# Altium schematic symbol library TI Amplifiers and Linear Special Function Amplifier.SchLib: 708 symbols (part 4 of 34)
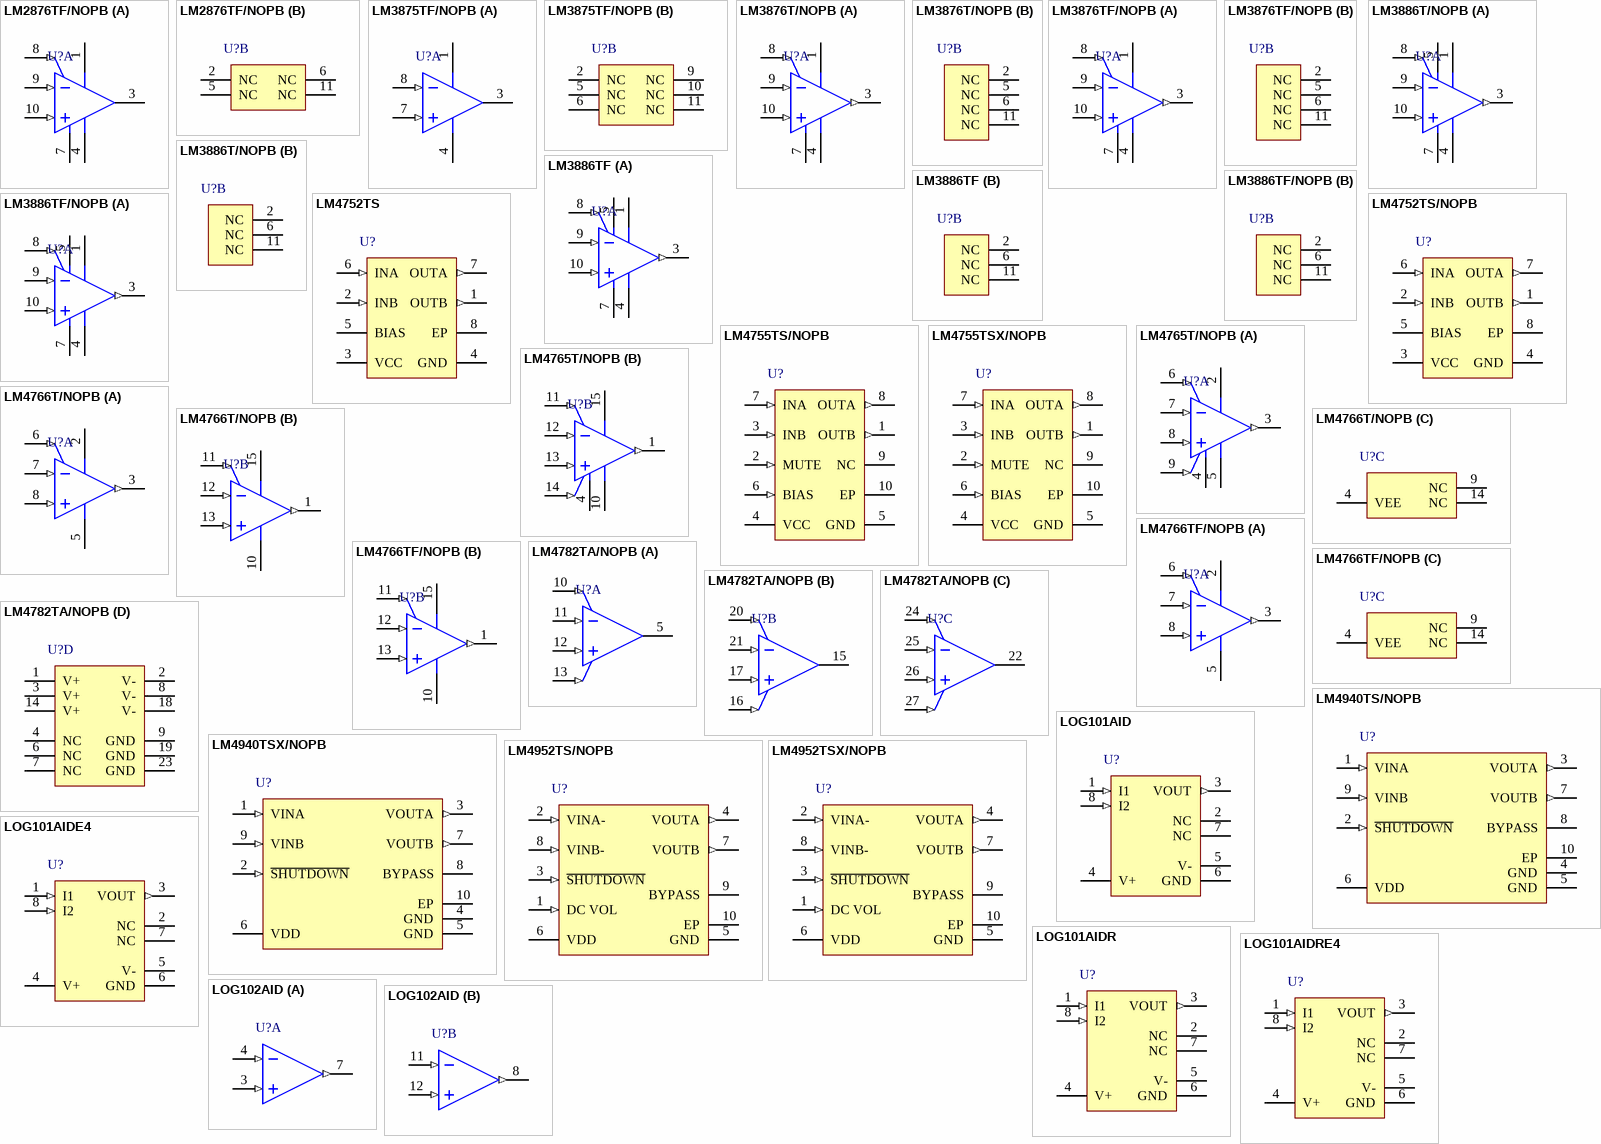
[diagram p42: symbols LM2876TF/NOPB to LOG102AID]

## LM4952TSX/NOPB
designator U?
3.1 W Stereo-SE Audio Power Amplifier with DC Volume Control, -40 to 85 degC, 9-pin DPAK (KTW9), Pb-Free (RoHS Exempt); Manufacturer: Texas Instruments; PartNumber: LM4952TSX/NOPB; Input Type: Analog; Max. Number of Speaker Outputs: 2; SubFamily: Mid/High-Power Amplifier; DatasheetVersion: SNAS230A; PackageVersion: Rev. B, 04/2013; PackageReference: TI-KTW9; PackageDescription: 9-Pin Plastic Flange Mount, Bdoy 10.16 x 4.57 mm, Pitch 0.97 mm; Supplier 1: Digi-Key; Supplier Part Number 1: LM4952TSX/NOPB-ND; Supplier 2: Mouser; Supplier Part Number 2: 926-LM4952TSX/NOPB; Eco-Plan: Pb-Free (RoHS Exempt); Mounting Technology: Through Hole; ComponentLink1Description: Manufacturer URL; ComponentLink1URL: http://www.ti.com/; ComponentLink2Description: Datasheet; ComponentLink2URL: http://www.ti.com/general/docs/lit/getliterature.tsp?genericPartNumber=LM4952&fileType=pdf; ComponentLink3Description: Package Specification; ComponentLink3URL: http://www.ti.com/lit/ml/mpsf047/mpsf047.pdf
footprint TI-KTW9_N (DPAK, 9-Leads, Body 10.16x8.69mm, Pitch 0.97mm, IPC Medium Density)
footprint TI-KTW9_L (DPAK, 9-Leads, Body 10.16x8.69mm, Pitch 0.97mm, IPC High Density)
footprint TI-KTW9_M (DPAK, 9-Leads, Body 10.16x8.69mm, Pitch 0.97mm, IPC Low Density)
pins: 1 DC VOL (in), 2 VINA- (in), 3 ~{SHUTDOWN} (in), 4 VOUTA (out), 5 GND (power), 6 VDD (power), 7 VOUTB (out), 8 VINB- (in), 9 BYPASS, 10 EP

## LOG101AID
designator U?
Logarithmic Amplifier, -40 to 85 degC, 8-pin SOIC (D8), Green (RoHS & no Sb/Br); Manufacturer: Texas Instruments; PartNumber: LOG101AID; Conformity Error (initial 5 decades)(Max)(%): 0.2; Full-Scale Output Voltage(Max)(+/- V): 1.5; Full-Scale Output Voltage(Min)(+/- V): 1.2; Input Current Range(Max)(mA): 3.5; Input Current Range(Min)(nA): 0.1; Reference Type: External; Scale Factor(V/decade): 1; Vs (+/-)(Max)(V): 18; Vs (+/-)(Min)(V): 4.5; DatasheetVersion: SBOS242B; PackageVersion: 4040047-3/M, 06/2011; PackageReference: D8; PackageDescription: 8-Pin Plastic Small Outline, Body 4.9 x 3.9 mm, Pitch 1.27 mm; Supplier 1: Digi-Key; Supplier Part Number 1: 296-12850-5-ND; Supplier 2: Newark; Supplier Part Number 2: 75C0874; Supplier 3: Mouser; Supplier Part Number 3: 595-LOG101AID; Eco-Plan: Green (RoHS & no Sb/Br); Iq(Max)(mA): 1.5; Offset Voltage (Input Amplifiers)(Max)(mV): 1.5; SubFamily: Logarithmic Amplifier; Mounting Technology: Surface Mount; Code_JEDEC: MS-012; ComponentLink1Description: Manufacturer URL; ComponentLink1URL: http://www.ti.com/; ComponentLink2Description: Datasheet; ComponentLink2URL: http://www.ti.com/general/docs/lit/getliterature.tsp?genericPartNumber=LOG101&fileType=pdf; ComponentLink3Description: Package Specification; ComponentLink3URL: http://www.ti.com/litv/pdf/msoi002j
footprint TI-D8_N (SOIC, 8-Leads, Body 5x4mm, Pitch 1.27mm, IPC Medium Density)
footprint TI-D8_L (SOIC, 8-Leads, Body 5x4mm, Pitch 1.27mm, IPC High Density)
footprint TI-D8_M (SOIC, 8-Leads, Body 5x4mm, Pitch 1.27mm, IPC Low Density)
pins: 1 I1 (in), 2 NC, 3 VOUT (out), 4 V+ (power), 5 V- (power), 6 GND (power), 7 NC, 8 I2 (in)

## LOG101AIDE4
designator U?
Logarithmic Amplifier, -40 to 85 degC, 8-pin SOIC (D8), Green (RoHS & no Sb/Br); Manufacturer: Texas Instruments; PartNumber: LOG101AIDE4; Conformity Error (initial 5 decades)(Max)(%): 0.2; Full-Scale Output Voltage(Max)(+/- V): 1.5; Full-Scale Output Voltage(Min)(+/- V): 1.2; Input Current Range(Max)(mA): 3.5; Input Current Range(Min)(nA): 0.1; Reference Type: External; Scale Factor(V/decade): 1; Vs (+/-)(Max)(V): 18; Vs (+/-)(Min)(V): 4.5; DatasheetVersion: SBOS242B; PackageVersion: 4040047-3/M, 06/2011; PackageReference: D8; PackageDescription: 8-Pin Plastic Small Outline, Body 4.9 x 3.9 mm, Pitch 1.27 mm; Supplier 1: Digi-Key; Supplier Part Number 1: LOG101AIDE4-ND; Supplier 2: Farnell; Supplier Part Number 2: 1206918; Supplier 3: Newark; Supplier Part Number 3: 97K3622; Supplier 4: Mouser; Supplier Part Number 4: 595-LOG101AIDE4; Eco-Plan: Green (RoHS & no Sb/Br); Iq(Max)(mA): 1.5; Offset Voltage (Input Amplifiers)(Max)(mV): 1.5; SubFamily: Logarithmic Amplifier; Mounting Technology: Surface Mount; Code_JEDEC: MS-012; ComponentLink1Description: Manufacturer URL; ComponentLink1URL: http://www.ti.com/; ComponentLink2Description: Datasheet; ComponentLink2URL: http://www.ti.com/general/docs/lit/getliterature.tsp?genericPartNumber=LOG101&fileType=pdf; ComponentLink3Description: Package Specification; ComponentLink3URL: http://www.ti.com/litv/pdf/msoi002j
footprint TI-D8_N (SOIC, 8-Leads, Body 5x4mm, Pitch 1.27mm, IPC Medium Density)
footprint TI-D8_L (SOIC, 8-Leads, Body 5x4mm, Pitch 1.27mm, IPC High Density)
footprint TI-D8_M (SOIC, 8-Leads, Body 5x4mm, Pitch 1.27mm, IPC Low Density)
pins: 1 I1 (in), 2 NC, 3 VOUT (out), 4 V+ (power), 5 V- (power), 6 GND (power), 7 NC, 8 I2 (in)

## LOG101AIDR
designator U?
Logarithmic Amplifier, -40 to 85 degC, 8-pin SOIC (D8), Green (RoHS & no Sb/Br); Manufacturer: Texas Instruments; PartNumber: LOG101AIDR; Conformity Error (initial 5 decades)(Max)(%): 0.2; Full-Scale Output Voltage(Max)(+/- V): 1.5; Full-Scale Output Voltage(Min)(+/- V): 1.2; Input Current Range(Max)(mA): 3.5; Input Current Range(Min)(nA): 0.1; Reference Type: External; Scale Factor(V/decade): 1; Vs (+/-)(Max)(V): 18; Vs (+/-)(Min)(V): 4.5; DatasheetVersion: SBOS242B; PackageVersion: 4040047-3/M, 06/2011; PackageReference: D8; PackageDescription: 8-Pin Plastic Small Outline, Body 4.9 x 3.9 mm, Pitch 1.27 mm; Supplier 1: Digi-Key; Supplier Part Number 1: LOG101AIDR-ND; Supplier 2: Mouser; Supplier Part Number 2: 595-LOG101AIDR; Eco-Plan: Green (RoHS & no Sb/Br); Iq(Max)(mA): 1.5; Offset Voltage (Input Amplifiers)(Max)(mV): 1.5; SubFamily: Logarithmic Amplifier; Mounting Technology: Surface Mount; Code_JEDEC: MS-012; ComponentLink1Description: Manufacturer URL; ComponentLink1URL: http://www.ti.com/; ComponentLink2Description: Datasheet; ComponentLink2URL: http://www.ti.com/general/docs/lit/getliterature.tsp?genericPartNumber=LOG101&fileType=pdf; ComponentLink3Description: Package Specification; ComponentLink3URL: http://www.ti.com/litv/pdf/msoi002j
footprint TI-D8_N (SOIC, 8-Leads, Body 5x4mm, Pitch 1.27mm, IPC Medium Density)
footprint TI-D8_L (SOIC, 8-Leads, Body 5x4mm, Pitch 1.27mm, IPC High Density)
footprint TI-D8_M (SOIC, 8-Leads, Body 5x4mm, Pitch 1.27mm, IPC Low Density)
pins: 1 I1 (in), 2 NC, 3 VOUT (out), 4 V+ (power), 5 V- (power), 6 GND (power), 7 NC, 8 I2 (in)

## LOG101AIDRE4
designator U?
Logarithmic Amplifier, -40 to 85 degC, 8-pin SOIC (D8), Green (RoHS & no Sb/Br); Manufacturer: Texas Instruments; PartNumber: LOG101AIDRE4; Conformity Error (initial 5 decades)(Max)(%): 0.2; Full-Scale Output Voltage(Max)(+/- V): 1.5; Full-Scale Output Voltage(Min)(+/- V): 1.2; Input Current Range(Max)(mA): 3.5; Input Current Range(Min)(nA): 0.1; Reference Type: External; Scale Factor(V/decade): 1; Vs (+/-)(Max)(V): 18; Vs (+/-)(Min)(V): 4.5; DatasheetVersion: SBOS242B; PackageVersion: 4040047-3/M, 06/2011; PackageReference: D8; PackageDescription: 8-Pin Plastic Small Outline, Body 4.9 x 3.9 mm, Pitch 1.27 mm; Supplier 1: Digi-Key; Supplier Part Number 1: LOG101AIDRE4-ND; Supplier 2: Mouser; Supplier Part Number 2: 595-LOG101AIDRE4; Eco-Plan: Green (RoHS & no Sb/Br); Iq(Max)(mA): 1.5; Offset Voltage (Input Amplifiers)(Max)(mV): 1.5; SubFamily: Logarithmic Amplifier; Mounting Technology: Surface Mount; Code_JEDEC: MS-012; ComponentLink1Description: Manufacturer URL; ComponentLink1URL: http://www.ti.com/; ComponentLink2Description: Datasheet; ComponentLink2URL: http://www.ti.com/general/docs/lit/getliterature.tsp?genericPartNumber=LOG101&fileType=pdf; ComponentLink3Description: Package Specification; ComponentLink3URL: http://www.ti.com/litv/pdf/msoi002j
footprint TI-D8_N (SOIC, 8-Leads, Body 5x4mm, Pitch 1.27mm, IPC Medium Density)
footprint TI-D8_L (SOIC, 8-Leads, Body 5x4mm, Pitch 1.27mm, IPC High Density)
footprint TI-D8_M (SOIC, 8-Leads, Body 5x4mm, Pitch 1.27mm, IPC Low Density)
pins: 1 I1 (in), 2 NC, 3 VOUT (out), 4 V+ (power), 5 V- (power), 6 GND (power), 7 NC, 8 I2 (in)

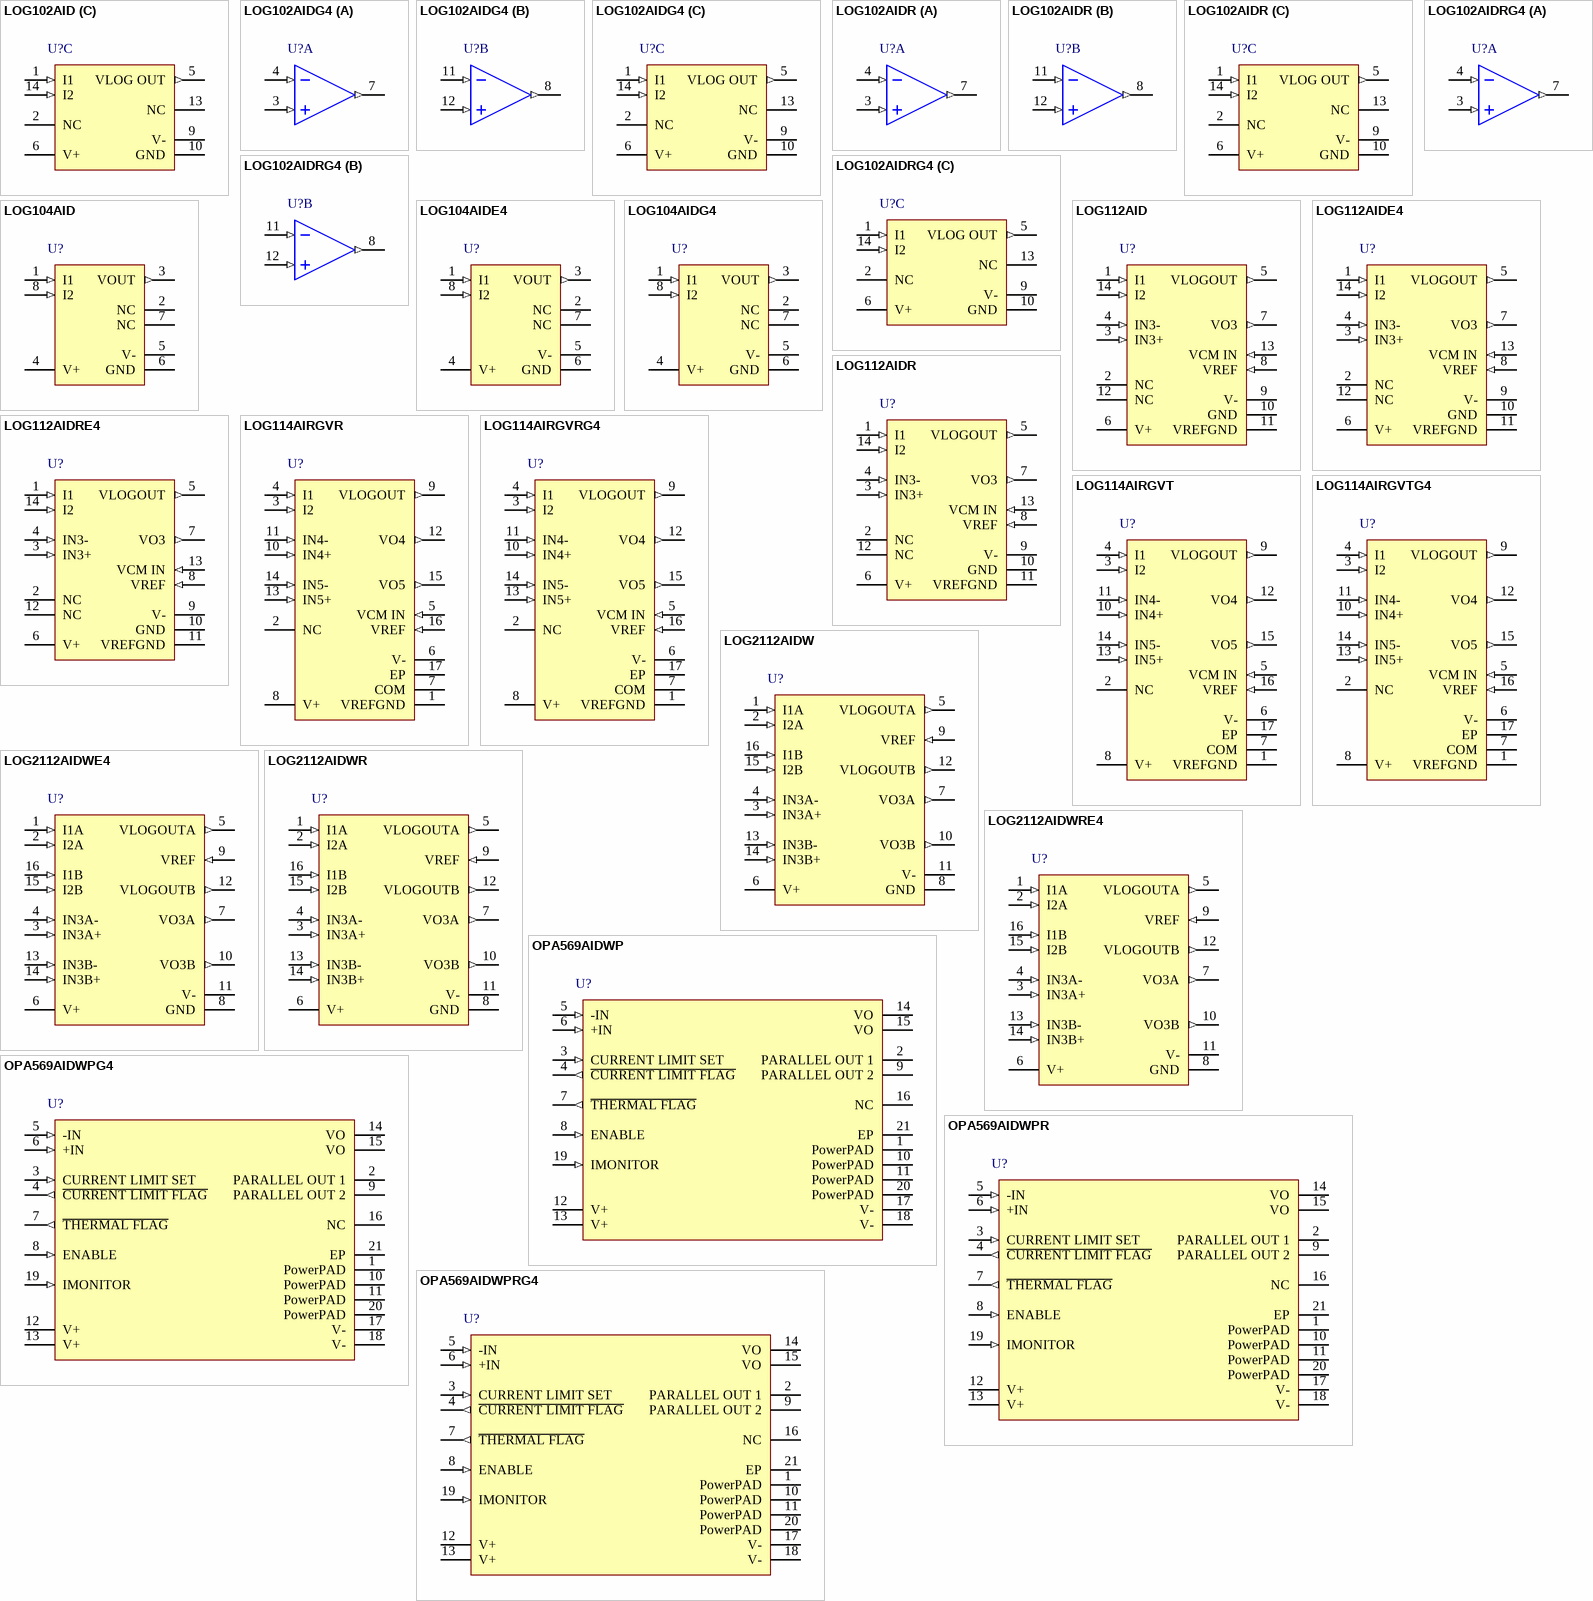
[diagram p4: symbols LOG102AID to OPA569AIDWPRG4]

## LOG102AID
designator U?
Logarithmic and Log Ratio Amplifier, 0 to 70 degC, 14-pin SOIC (D14), Green (RoHS & no Sb/Br); Manufacturer: Texas Instruments; PartNumber: LOG102AID; Conformity Error (initial 5 decades)(Max)(%): 0.3; Full-Scale Output Voltage(Max)(+/- V): 1.5; Full-Scale Output Voltage(Min)(+/- V): 1.2; Input Current Range(Max)(mA): 1; Iq(Max)(mA): 2; Offset Voltage (Input Amplifiers)(Max)(mV): 0.75; Reference Type: External; SubFamily: Logarithmic Amplifier; Vs (+/-)(Max)(V): 18; Vs (+/-)(Min)(V): 4.5; DatasheetVersion: SBOS211B; PackageVersion: 4040047-5/M, 06/2011; PackageReference: D14; PackageDescription: 14-Pin Plastic Small Outline, Body 8.65 x 3.9 mm, Pitch 1.27 mm; Supplier 1: Digi-Key; Supplier Part Number 1: LOG102AID-ND; Supplier 2: Farnell; Supplier Part Number 2: 1212428; Supplier 3: Newark; Supplier Part Number 3: 04M4564; Supplier 4: Mouser; Supplier Part Number 4: 595-LOG102AID; Eco-Plan: Green (RoHS & no Sb/Br); Input Current Range(Min)(nA): 1; Scale Factor(V/decade): 1; Mounting Technology: Surface Mount; Code_JEDEC: MS-012; ComponentLink1Description: Manufacturer URL; ComponentLink1URL: http://www.ti.com/; ComponentLink2Description: Datasheet; ComponentLink2URL: http://www.ti.com/general/docs/lit/getliterature.tsp?genericPartNumber=LOG102&fileType=pdf; ComponentLink3Description: Package Specification; ComponentLink3URL: http://www.ti.com/lit/ml/mpds177g/mpds177g.pdf
footprint TI-D14_N (SOIC, 14-Leads, Body 8.75x4mm, Pitch 1.27mm, IPC Medium Density)
footprint TI-D14_L (SOIC, 14-Leads, Body 8.75x4mm, Pitch 1.27mm, IPC High Density)
footprint TI-D14_M (SOIC, 14-Leads, Body 8.75x4mm, Pitch 1.27mm, IPC Low Density)
part A pins: 3 IN3+ (in), 4 IN3- (in), 7 VOUT3 (out)
part B pins: 8 VOUT4 (out), 11 IN4- (in), 12 IN4+ (in)
part C pins: 1 I1 (in), 2 NC, 5 VLOG OUT (out), 6 V+ (power), 9 V- (power), 10 GND (power), 13 NC, 14 I2 (in)

## LOG102AIDG4
designator U?
Logarithmic and Log Ratio Amplifier, 0 to 70 degC, 14-pin SOIC (D14), Green (RoHS & no Sb/Br); Manufacturer: Texas Instruments; PartNumber: LOG102AIDG4; Conformity Error (initial 5 decades)(Max)(%): 0.3; Full-Scale Output Voltage(Max)(+/- V): 1.5; Full-Scale Output Voltage(Min)(+/- V): 1.2; Input Current Range(Max)(mA): 1; Iq(Max)(mA): 2; Offset Voltage (Input Amplifiers)(Max)(mV): 0.75; Reference Type: External; SubFamily: Logarithmic Amplifier; Vs (+/-)(Max)(V): 18; Vs (+/-)(Min)(V): 4.5; DatasheetVersion: SBOS211B; PackageVersion: 4040047-5/M, 06/2011; PackageReference: D14; PackageDescription: 14-Pin Plastic Small Outline, Body 8.65 x 3.9 mm, Pitch 1.27 mm; Supplier 1: Digi-Key; Supplier Part Number 1: LOG102AIDG4-ND; Supplier 2: Newark; Supplier Part Number 2: 20M5563; Supplier 3: Mouser; Supplier Part Number 3: 595-LOG102AIDG4; Eco-Plan: Green (RoHS & no Sb/Br); Input Current Range(Min)(nA): 1; Scale Factor(V/decade): 1; Mounting Technology: Surface Mount; Code_JEDEC: MS-012; ComponentLink1Description: Manufacturer URL; ComponentLink1URL: http://www.ti.com/; ComponentLink2Description: Datasheet; ComponentLink2URL: http://www.ti.com/general/docs/lit/getliterature.tsp?genericPartNumber=LOG102&fileType=pdf; ComponentLink3Description: Package Specification; ComponentLink3URL: http://www.ti.com/lit/ml/mpds177g/mpds177g.pdf
footprint TI-D14_N (SOIC, 14-Leads, Body 8.75x4mm, Pitch 1.27mm, IPC Medium Density)
footprint TI-D14_L (SOIC, 14-Leads, Body 8.75x4mm, Pitch 1.27mm, IPC High Density)
footprint TI-D14_M (SOIC, 14-Leads, Body 8.75x4mm, Pitch 1.27mm, IPC Low Density)
part A pins: 3 IN3+ (in), 4 IN3- (in), 7 VOUT3 (out)
part B pins: 8 VOUT4 (out), 11 IN4- (in), 12 IN4+ (in)
part C pins: 1 I1 (in), 2 NC, 5 VLOG OUT (out), 6 V+ (power), 9 V- (power), 10 GND (power), 13 NC, 14 I2 (in)

## LOG102AIDR
designator U?
Logarithmic and Log Ratio Amplifier, 0 to 70 degC, 14-pin SOIC (D14), Green (RoHS & no Sb/Br); Manufacturer: Texas Instruments; PartNumber: LOG102AIDR; Conformity Error (initial 5 decades)(Max)(%): 0.3; Full-Scale Output Voltage(Max)(+/- V): 1.5; Full-Scale Output Voltage(Min)(+/- V): 1.2; Input Current Range(Max)(mA): 1; Iq(Max)(mA): 2; Offset Voltage (Input Amplifiers)(Max)(mV): 0.75; Reference Type: External; SubFamily: Logarithmic Amplifier; Vs (+/-)(Max)(V): 18; Vs (+/-)(Min)(V): 4.5; DatasheetVersion: SBOS211B; PackageVersion: 4040047-5/M, 06/2011; PackageReference: D14; PackageDescription: 14-Pin Plastic Small Outline, Body 8.65 x 3.9 mm, Pitch 1.27 mm; Supplier 1: Digi-Key; Supplier Part Number 1: LOG102AIDR-ND; Supplier 2: Mouser; Supplier Part Number 2: 595-LOG102AIDR; Eco-Plan: Green (RoHS & no Sb/Br); Input Current Range(Min)(nA): 1; Scale Factor(V/decade): 1; Mounting Technology: Surface Mount; Code_JEDEC: MS-012; ComponentLink1Description: Manufacturer URL; ComponentLink1URL: http://www.ti.com/; ComponentLink2Description: Datasheet; ComponentLink2URL: http://www.ti.com/general/docs/lit/getliterature.tsp?genericPartNumber=LOG102&fileType=pdf; ComponentLink3Description: Package Specification; ComponentLink3URL: http://www.ti.com/lit/ml/mpds177g/mpds177g.pdf
footprint TI-D14_N (SOIC, 14-Leads, Body 8.75x4mm, Pitch 1.27mm, IPC Medium Density)
footprint TI-D14_L (SOIC, 14-Leads, Body 8.75x4mm, Pitch 1.27mm, IPC High Density)
footprint TI-D14_M (SOIC, 14-Leads, Body 8.75x4mm, Pitch 1.27mm, IPC Low Density)
part A pins: 3 IN3+ (in), 4 IN3- (in), 7 VOUT3 (out)
part B pins: 8 VOUT4 (out), 11 IN4- (in), 12 IN4+ (in)
part C pins: 1 I1 (in), 2 NC, 5 VLOG OUT (out), 6 V+ (power), 9 V- (power), 10 GND (power), 13 NC, 14 I2 (in)

## LOG102AIDRG4
designator U?
Logarithmic and Log Ratio Amplifier, 0 to 70 degC, 14-pin SOIC (D14), Green (RoHS & no Sb/Br); Manufacturer: Texas Instruments; PartNumber: LOG102AIDRG4; Conformity Error (initial 5 decades)(Max)(%): 0.3; Full-Scale Output Voltage(Max)(+/- V): 1.5; Full-Scale Output Voltage(Min)(+/- V): 1.2; Input Current Range(Max)(mA): 1; Iq(Max)(mA): 2; Offset Voltage (Input Amplifiers)(Max)(mV): 0.75; Reference Type: External; SubFamily: Logarithmic Amplifier; Vs (+/-)(Max)(V): 18; Vs (+/-)(Min)(V): 4.5; DatasheetVersion: SBOS211B; PackageVersion: 4040047-5/M, 06/2011; PackageReference: D14; PackageDescription: 14-Pin Plastic Small Outline, Body 8.65 x 3.9 mm, Pitch 1.27 mm; Supplier 1: Digi-Key; Supplier Part Number 1: LOG102AIDRG4-ND; Supplier 2: Mouser; Supplier Part Number 2: 595-LOG102AIDRG4; Eco-Plan: Green (RoHS & no Sb/Br); Input Current Range(Min)(nA): 1; Scale Factor(V/decade): 1; Mounting Technology: Surface Mount; Code_JEDEC: MS-012; ComponentLink1Description: Manufacturer URL; ComponentLink1URL: http://www.ti.com/; ComponentLink2Description: Datasheet; ComponentLink2URL: http://www.ti.com/general/docs/lit/getliterature.tsp?genericPartNumber=LOG102&fileType=pdf; ComponentLink3Description: Package Specification; ComponentLink3URL: http://www.ti.com/lit/ml/mpds177g/mpds177g.pdf
footprint TI-D14_N (SOIC, 14-Leads, Body 8.75x4mm, Pitch 1.27mm, IPC Medium Density)
footprint TI-D14_L (SOIC, 14-Leads, Body 8.75x4mm, Pitch 1.27mm, IPC High Density)
footprint TI-D14_M (SOIC, 14-Leads, Body 8.75x4mm, Pitch 1.27mm, IPC Low Density)
part A pins: 3 IN3+ (in), 4 IN3- (in), 7 VOUT3 (out)
part B pins: 8 VOUT4 (out), 11 IN4- (in), 12 IN4+ (in)
part C pins: 1 I1 (in), 2 NC, 5 VLOG OUT (out), 6 V+ (power), 9 V- (power), 10 GND (power), 13 NC, 14 I2 (in)

## LOG104AID
designator U?
Logarithmic Amplifier, -40 to 85 degC, 8-pin SOIC (D8), Green (RoHS & no Sb/Br); Manufacturer: Texas Instruments; PartNumber: LOG104AID; Conformity Error (initial 5 decades)(Max)(%): 0.2; Full-Scale Output Voltage(Max)(+/- V): 1.5; Full-Scale Output Voltage(Min)(+/- V): 1.2; Input Current Range(Max)(mA): 3.5; Input Current Range(Min)(nA): 0.1; Reference Type: External; Scale Factor(V/decade): 0.5; Vs (+/-)(Max)(V): 18; Vs (+/-)(Min)(V): 4.5; DatasheetVersion: SBOS243C; PackageVersion: 4040047-3/M, 06/2011; PackageReference: D8; PackageDescription: 8-Pin Plastic Small Outline, Body 4.9 x 3.9 mm, Pitch 1.27 mm; Supplier 1: Digi-Key; Supplier Part Number 1: 296-12851-5-ND; Supplier 2: Newark; Supplier Part Number 2: 75C0878; Supplier 3: Mouser; Supplier Part Number 3: 595-LOG104AID; Eco-Plan: Green (RoHS & no Sb/Br); Iq(Max)(mA): 1.5; Offset Voltage (Input Amplifiers)(Max)(mV): 1.5; SubFamily: Logarithmic Amplifier; Mounting Technology: Surface Mount; Code_JEDEC: MS-012; ComponentLink1Description: Manufacturer URL; ComponentLink1URL: http://www.ti.com/; ComponentLink2Description: Datasheet; ComponentLink2URL: http://www.ti.com/general/docs/lit/getliterature.tsp?genericPartNumber=LOG104&fileType=pdf; ComponentLink3Description: Package Specification; ComponentLink3URL: http://www.ti.com/litv/pdf/msoi002j
footprint TI-D8_N (SOIC, 8-Leads, Body 5x4mm, Pitch 1.27mm, IPC Medium Density)
footprint TI-D8_L (SOIC, 8-Leads, Body 5x4mm, Pitch 1.27mm, IPC High Density)
footprint TI-D8_M (SOIC, 8-Leads, Body 5x4mm, Pitch 1.27mm, IPC Low Density)
pins: 1 I1 (in), 2 NC, 3 VOUT (out), 4 V+ (power), 5 V- (power), 6 GND (power), 7 NC, 8 I2 (in)

## LOG104AIDE4
designator U?
Logarithmic Amplifier, -40 to 85 degC, 8-pin SOIC (D8), Green (RoHS & no Sb/Br); Manufacturer: Texas Instruments; PartNumber: LOG104AIDE4; Conformity Error (initial 5 decades)(Max)(%): 0.2; Full-Scale Output Voltage(Max)(+/- V): 1.5; Full-Scale Output Voltage(Min)(+/- V): 1.2; Input Current Range(Max)(mA): 3.5; Input Current Range(Min)(nA): 0.1; Reference Type: External; Scale Factor(V/decade): 0.5; Vs (+/-)(Max)(V): 18; Vs (+/-)(Min)(V): 4.5; DatasheetVersion: SBOS243C; PackageVersion: 4040047-3/M, 06/2011; PackageReference: D8; PackageDescription: 8-Pin Plastic Small Outline, Body 4.9 x 3.9 mm, Pitch 1.27 mm; Supplier 1: Digi-Key; Supplier Part Number 1: LOG104AIDE4-ND; Supplier 2: Mouser; Supplier Part Number 2: 595-LOG104AIDE4; Eco-Plan: Green (RoHS & no Sb/Br); Iq(Max)(mA): 1.5; Offset Voltage (Input Amplifiers)(Max)(mV): 1.5; SubFamily: Logarithmic Amplifier; Mounting Technology: Surface Mount; Code_JEDEC: MS-012; ComponentLink1Description: Manufacturer URL; ComponentLink1URL: http://www.ti.com/; ComponentLink2Description: Datasheet; ComponentLink2URL: http://www.ti.com/general/docs/lit/getliterature.tsp?genericPartNumber=LOG104&fileType=pdf; ComponentLink3Description: Package Specification; ComponentLink3URL: http://www.ti.com/litv/pdf/msoi002j
footprint TI-D8_N (SOIC, 8-Leads, Body 5x4mm, Pitch 1.27mm, IPC Medium Density)
footprint TI-D8_L (SOIC, 8-Leads, Body 5x4mm, Pitch 1.27mm, IPC High Density)
footprint TI-D8_M (SOIC, 8-Leads, Body 5x4mm, Pitch 1.27mm, IPC Low Density)
pins: 1 I1 (in), 2 NC, 3 VOUT (out), 4 V+ (power), 5 V- (power), 6 GND (power), 7 NC, 8 I2 (in)

## LOG104AIDG4
designator U?
Logarithmic Amplifier, -40 to 85 degC, 8-pin SOIC (D8), Green (RoHS & no Sb/Br); Manufacturer: Texas Instruments; PartNumber: LOG104AIDG4; Conformity Error (initial 5 decades)(Max)(%): 0.2; Full-Scale Output Voltage(Max)(+/- V): 1.5; Full-Scale Output Voltage(Min)(+/- V): 1.2; Input Current Range(Max)(mA): 3.5; Input Current Range(Min)(nA): 0.1; Reference Type: External; Scale Factor(V/decade): 0.5; Vs (+/-)(Max)(V): 18; Vs (+/-)(Min)(V): 4.5; DatasheetVersion: SBOS243C; PackageVersion: 4040047-3/M, 06/2011; PackageReference: D8; PackageDescription: 8-Pin Plastic Small Outline, Body 4.9 x 3.9 mm, Pitch 1.27 mm; Supplier 1: Digi-Key; Supplier Part Number 1: LOG104AIDG4-ND; Supplier 2: Mouser; Supplier Part Number 2: 595-LOG104AIDG4; Eco-Plan: Green (RoHS & no Sb/Br); Iq(Max)(mA): 1.5; Offset Voltage (Input Amplifiers)(Max)(mV): 1.5; SubFamily: Logarithmic Amplifier; Mounting Technology: Surface Mount; Code_JEDEC: MS-012; ComponentLink1Description: Manufacturer URL; ComponentLink1URL: http://www.ti.com/; ComponentLink2Description: Datasheet; ComponentLink2URL: http://www.ti.com/general/docs/lit/getliterature.tsp?genericPartNumber=LOG104&fileType=pdf; ComponentLink3Description: Package Specification; ComponentLink3URL: http://www.ti.com/litv/pdf/msoi002j
footprint TI-D8_N (SOIC, 8-Leads, Body 5x4mm, Pitch 1.27mm, IPC Medium Density)
footprint TI-D8_L (SOIC, 8-Leads, Body 5x4mm, Pitch 1.27mm, IPC High Density)
footprint TI-D8_M (SOIC, 8-Leads, Body 5x4mm, Pitch 1.27mm, IPC Low Density)
pins: 1 I1 (in), 2 NC, 3 VOUT (out), 4 V+ (power), 5 V- (power), 6 GND (power), 7 NC, 8 I2 (in)

## LOG112AID
designator U?
Precision Logarithmic and Log Ratio Amplifier with On-Chip 2.5 V Voltage Reference, -5 to 75 degC, 14-pin SOIC (D14), Green (RoHS & no Sb/Br); Manufacturer: Texas Instruments; PartNumber: LOG112AID; Conformity Error (initial 5 decades)(Max)(%): 0.2; Full-Scale Output Voltage(Max)(+/- V): 1.5; Full-Scale Output Voltage(Min)(+/- V): 1.2; Input Current Range(Max)(mA): 3.5; Input Current Range(Min)(nA): 0.1; Iq(Max)(mA): 1.75; Reference Type: Internal; Scale Factor(V/decade): 0.5; SubFamily: Logarithmic Amplifier; Vs (+/-)(Max)(V): 18; Vs (+/-)(Min)(V): 4.5; DatasheetVersion: SBOS246D; PackageVersion: 4040047-5/M, 06/2011; PackageReference: D14; PackageDescription: 14-Pin Plastic Small Outline, Body 8.65 x 3.9 mm, Pitch 1.27 mm; Supplier 1: Digi-Key; Supplier Part Number 1: 296-13456-5-ND; Supplier 2: Farnell; Supplier Part Number 2: 1214431; Supplier 3: Newark; Supplier Part Number 3: 01M8175; Supplier 4: Newark; Supplier Part Number 4: 14M8175; Supplier 5: Mouser; Supplier Part Number 5: 595-LOG112AID; Eco-Plan: Green (RoHS & no Sb/Br); Offset Voltage (Input Amplifiers)(Max)(mV): 1.5; Mounting Technology: Surface Mount; Code_JEDEC: MS-012; ComponentLink1Description: Manufacturer URL; ComponentLink1URL: http://www.ti.com/; ComponentLink2Description: Datasheet; ComponentLink2URL: http://www.ti.com/general/docs/lit/getliterature.tsp?genericPartNumber=LOG112&fileType=pdf; ComponentLink3Description: Package Specification; ComponentLink3URL: http://www.ti.com/lit/ml/mpds177g/mpds177g.pdf
footprint TI-D14_N (SOIC, 14-Leads, Body 8.75x4mm, Pitch 1.27mm, IPC Medium Density)
footprint TI-D14_L (SOIC, 14-Leads, Body 8.75x4mm, Pitch 1.27mm, IPC High Density)
footprint TI-D14_M (SOIC, 14-Leads, Body 8.75x4mm, Pitch 1.27mm, IPC Low Density)
pins: 1 I1 (in), 2 NC, 3 IN3+ (in), 4 IN3- (in), 5 VLOGOUT (out), 6 V+ (power), 7 VO3 (out), 8 VREF (in), 9 V- (power), 10 GND (power), 11 VREFGND (power), 12 NC, 13 VCM IN (in), 14 I2 (in)

## LOG112AIDE4
designator U?
Precision Logarithmic and Log Ratio Amplifier with On-Chip 2.5 V Voltage Reference, -5 to 75 degC, 14-pin SOIC (D14), Green (RoHS & no Sb/Br); Manufacturer: Texas Instruments; PartNumber: LOG112AIDE4; Conformity Error (initial 5 decades)(Max)(%): 0.2; Full-Scale Output Voltage(Max)(+/- V): 1.5; Full-Scale Output Voltage(Min)(+/- V): 1.2; Input Current Range(Max)(mA): 3.5; Input Current Range(Min)(nA): 0.1; Iq(Max)(mA): 1.75; Reference Type: Internal; Scale Factor(V/decade): 0.5; SubFamily: Logarithmic Amplifier; Vs (+/-)(Max)(V): 18; Vs (+/-)(Min)(V): 4.5; DatasheetVersion: SBOS246D; PackageVersion: 4040047-5/M, 06/2011; PackageReference: D14; PackageDescription: 14-Pin Plastic Small Outline, Body 8.65 x 3.9 mm, Pitch 1.27 mm; Supplier 1: Digi-Key; Supplier Part Number 1: LOG112AIDE4-ND; Supplier 2: Mouser; Supplier Part Number 2: 595-LOG112AIDE4; Eco-Plan: Green (RoHS & no Sb/Br); Offset Voltage (Input Amplifiers)(Max)(mV): 1.5; Mounting Technology: Surface Mount; Code_JEDEC: MS-012; ComponentLink1Description: Manufacturer URL; ComponentLink1URL: http://www.ti.com/; ComponentLink2Description: Datasheet; ComponentLink2URL: http://www.ti.com/general/docs/lit/getliterature.tsp?genericPartNumber=LOG112&fileType=pdf; ComponentLink3Description: Package Specification; ComponentLink3URL: http://www.ti.com/lit/ml/mpds177g/mpds177g.pdf
footprint TI-D14_N (SOIC, 14-Leads, Body 8.75x4mm, Pitch 1.27mm, IPC Medium Density)
footprint TI-D14_L (SOIC, 14-Leads, Body 8.75x4mm, Pitch 1.27mm, IPC High Density)
footprint TI-D14_M (SOIC, 14-Leads, Body 8.75x4mm, Pitch 1.27mm, IPC Low Density)
pins: 1 I1 (in), 2 NC, 3 IN3+ (in), 4 IN3- (in), 5 VLOGOUT (out), 6 V+ (power), 7 VO3 (out), 8 VREF (in), 9 V- (power), 10 GND (power), 11 VREFGND (power), 12 NC, 13 VCM IN (in), 14 I2 (in)

## LOG112AIDR
designator U?
Precision Logarithmic and Log Ratio Amplifier with On-Chip 2.5 V Voltage Reference, -5 to 75 degC, 14-pin SOIC (D14), Green (RoHS & no Sb/Br); Manufacturer: Texas Instruments; PartNumber: LOG112AIDR; Conformity Error (initial 5 decades)(Max)(%): 0.2; Full-Scale Output Voltage(Max)(+/- V): 1.5; Full-Scale Output Voltage(Min)(+/- V): 1.2; Input Current Range(Max)(mA): 3.5; Input Current Range(Min)(nA): 0.1; Iq(Max)(mA): 1.75; Reference Type: Internal; Scale Factor(V/decade): 0.5; SubFamily: Logarithmic Amplifier; Vs (+/-)(Max)(V): 18; Vs (+/-)(Min)(V): 4.5; DatasheetVersion: SBOS246D; PackageVersion: 4040047-5/M, 06/2011; PackageReference: D14; PackageDescription: 14-Pin Plastic Small Outline, Body 8.65 x 3.9 mm, Pitch 1.27 mm; Supplier 1: Digi-Key; Supplier Part Number 1: LOG112AIDR-ND; Supplier 2: Newark; Supplier Part Number 2: 83C6926; Supplier 3: Mouser; Supplier Part Number 3: 595-LOG112AIDR; Eco-Plan: Green (RoHS & no Sb/Br); Offset Voltage (Input Amplifiers)(Max)(mV): 1.5; Mounting Technology: Surface Mount; Code_JEDEC: MS-012; ComponentLink1Description: Manufacturer URL; ComponentLink1URL: http://www.ti.com/; ComponentLink2Description: Datasheet; ComponentLink2URL: http://www.ti.com/general/docs/lit/getliterature.tsp?genericPartNumber=LOG112&fileType=pdf; ComponentLink3Description: Package Specification; ComponentLink3URL: http://www.ti.com/lit/ml/mpds177g/mpds177g.pdf
footprint TI-D14_N (SOIC, 14-Leads, Body 8.75x4mm, Pitch 1.27mm, IPC Medium Density)
footprint TI-D14_L (SOIC, 14-Leads, Body 8.75x4mm, Pitch 1.27mm, IPC High Density)
footprint TI-D14_M (SOIC, 14-Leads, Body 8.75x4mm, Pitch 1.27mm, IPC Low Density)
pins: 1 I1 (in), 2 NC, 3 IN3+ (in), 4 IN3- (in), 5 VLOGOUT (out), 6 V+ (power), 7 VO3 (out), 8 VREF (in), 9 V- (power), 10 GND (power), 11 VREFGND (power), 12 NC, 13 VCM IN (in), 14 I2 (in)

## LOG112AIDRE4
designator U?
Precision Logarithmic and Log Ratio Amplifier with On-Chip 2.5 V Voltage Reference, -5 to 75 degC, 14-pin SOIC (D14), Green (RoHS & no Sb/Br); Manufacturer: Texas Instruments; PartNumber: LOG112AIDRE4; Conformity Error (initial 5 decades)(Max)(%): 0.2; Full-Scale Output Voltage(Max)(+/- V): 1.5; Full-Scale Output Voltage(Min)(+/- V): 1.2; Input Current Range(Max)(mA): 3.5; Input Current Range(Min)(nA): 0.1; Iq(Max)(mA): 1.75; Reference Type: Internal; Scale Factor(V/decade): 0.5; SubFamily: Logarithmic Amplifier; Vs (+/-)(Max)(V): 18; Vs (+/-)(Min)(V): 4.5; DatasheetVersion: SBOS246D; PackageVersion: 4040047-5/M, 06/2011; PackageReference: D14; PackageDescription: 14-Pin Plastic Small Outline, Body 8.65 x 3.9 mm, Pitch 1.27 mm; Supplier 1: Digi-Key; Supplier Part Number 1: LOG112AIDRE4-ND; Supplier 2: Newark; Supplier Part Number 2: 61K0068; Supplier 3: Mouser; Supplier Part Number 3: 595-LOG112AIDRE4; Eco-Plan: Green (RoHS & no Sb/Br); Offset Voltage (Input Amplifiers)(Max)(mV): 1.5; Mounting Technology: Surface Mount; Code_JEDEC: MS-012; ComponentLink1Description: Manufacturer URL; ComponentLink1URL: http://www.ti.com/; ComponentLink2Description: Datasheet; ComponentLink2URL: http://www.ti.com/general/docs/lit/getliterature.tsp?genericPartNumber=LOG112&fileType=pdf; ComponentLink3Description: Package Specification; ComponentLink3URL: http://www.ti.com/lit/ml/mpds177g/mpds177g.pdf
footprint TI-D14_N (SOIC, 14-Leads, Body 8.75x4mm, Pitch 1.27mm, IPC Medium Density)
footprint TI-D14_L (SOIC, 14-Leads, Body 8.75x4mm, Pitch 1.27mm, IPC High Density)
footprint TI-D14_M (SOIC, 14-Leads, Body 8.75x4mm, Pitch 1.27mm, IPC Low Density)
pins: 1 I1 (in), 2 NC, 3 IN3+ (in), 4 IN3- (in), 5 VLOGOUT (out), 6 V+ (power), 7 VO3 (out), 8 VREF (in), 9 V- (power), 10 GND (power), 11 VREFGND (power), 12 NC, 13 VCM IN (in), 14 I2 (in)

## LOG114AIRGVR
designator U?
Precision High-Speed Logarithmic Amplifier with 2.5 V Reference and Uncommitted Output Operational Amplifier, -40 to 85 degC, 16-pin QFN (RGV16), Green (RoHS & no Sb/Br); Manufacturer: Texas Instruments; PartNumber: LOG114AIRGVR; Conformity Error (initial 5 decades)(Max)(%): 0.2; Input Current Range(Max)(mA): 10; Input Current Range(Min)(nA): 0.1; Iq(Max)(mA): 15; Offset Voltage (Input Amplifiers)(Max)(mV): 4; Reference Type: Internal; Scale Factor(V/decade): 0.375; Vs (+/-)(Max)(V): 11; Vs (+/-)(Min)(V): 4.8; DatasheetVersion: SBOS301A; PackageVersion: 4203497/F, 06/2011; PackageReference: RGV16-2160X2160TP; PackageDescription: 16-Pin Plastic Quad Flatpack No-Lead, Body 4 x 4 mm, Pitch 0.65 mm; Supplier 1: Digi-Key; Supplier Part Number 1: LOG114AIRGVR-ND; Supplier 2: Mouser; Supplier Part Number 2: 595-LOG114AIRGVR; Eco-Plan: Green (RoHS & no Sb/Br); SubFamily: Logarithmic Amplifier; Mounting Technology: Surface Mount; Code_JEDEC: MO-220; ComponentLink1Description: Manufacturer URL; ComponentLink1URL: http://www.ti.com/; ComponentLink2Description: Datasheet; ComponentLink2URL: http://www.ti.com/general/docs/lit/getliterature.tsp?genericPartNumber=LOG114&fileType=pdf; ComponentLink3Description: Package Specification; ComponentLink3URL: http://www.ti.com/litv/pdf/mpqf121e
footprint TI-RGV16-2160X2160TP_V (QFN, 16-Leads, Body 4x4mm, Pitch 0.65mm, Thermal Pad 2.16 x 2.16mm)
pins: 1 VREFGND (power), 2 NC, 3 I2 (in), 4 I1 (in), 5 VCM IN (in), 6 V- (power), 7 COM (power), 8 V+ (power), 9 VLOGOUT (out), 10 IN4+ (in), 11 IN4- (in), 12 VO4 (out), 13 IN5+ (in), 14 IN5- (in), 15 VO5 (out), 16 VREF (in), 17 EP (power)

## LOG114AIRGVRG4
designator U?
Precision High-Speed Logarithmic Amplifier with 2.5 V Reference and Uncommitted Output Operational Amplifier, -40 to 85 degC, 16-pin QFN (RGV16), Green (RoHS & no Sb/Br); Manufacturer: Texas Instruments; PartNumber: LOG114AIRGVRG4; Conformity Error (initial 5 decades)(Max)(%): 0.2; Input Current Range(Max)(mA): 10; Input Current Range(Min)(nA): 0.1; Iq(Max)(mA): 15; Offset Voltage (Input Amplifiers)(Max)(mV): 4; Reference Type: Internal; Scale Factor(V/decade): 0.375; Vs (+/-)(Max)(V): 11; Vs (+/-)(Min)(V): 4.8; DatasheetVersion: SBOS301A; PackageVersion: 4203497/F, 06/2011; PackageReference: RGV16-2160X2160TP; PackageDescription: 16-Pin Plastic Quad Flatpack No-Lead, Body 4 x 4 mm, Pitch 0.65 mm; Supplier 1: Digi-Key; Supplier Part Number 1: LOG114AIRGVRG4-ND; Supplier 2: Mouser; Supplier Part Number 2: 595-LOG114AIRGVRG4; Eco-Plan: Green (RoHS & no Sb/Br); SubFamily: Logarithmic Amplifier; Mounting Technology: Surface Mount; Code_JEDEC: MO-220; ComponentLink1Description: Manufacturer URL; ComponentLink1URL: http://www.ti.com/; ComponentLink2Description: Datasheet; ComponentLink2URL: http://www.ti.com/general/docs/lit/getliterature.tsp?genericPartNumber=LOG114&fileType=pdf; ComponentLink3Description: Package Specification; ComponentLink3URL: http://www.ti.com/litv/pdf/mpqf121e
footprint TI-RGV16-2160X2160TP_V (QFN, 16-Leads, Body 4x4mm, Pitch 0.65mm, Thermal Pad 2.16 x 2.16mm)
pins: 1 VREFGND (power), 2 NC, 3 I2 (in), 4 I1 (in), 5 VCM IN (in), 6 V- (power), 7 COM (power), 8 V+ (power), 9 VLOGOUT (out), 10 IN4+ (in), 11 IN4- (in), 12 VO4 (out), 13 IN5+ (in), 14 IN5- (in), 15 VO5 (out), 16 VREF (in), 17 EP (power)

## LOG114AIRGVT
designator U?
Precision High-Speed Logarithmic Amplifier with 2.5 V Reference and Uncommitted Output Operational Amplifier, -40 to 85 degC, 16-pin QFN (RGV16), Green (RoHS & no Sb/Br); Manufacturer: Texas Instruments; PartNumber: LOG114AIRGVT; Conformity Error (initial 5 decades)(Max)(%): 0.2; Input Current Range(Max)(mA): 10; Input Current Range(Min)(nA): 0.1; Iq(Max)(mA): 15; Offset Voltage (Input Amplifiers)(Max)(mV): 4; Reference Type: Internal; Scale Factor(V/decade): 0.375; Vs (+/-)(Max)(V): 11; Vs (+/-)(Min)(V): 4.8; DatasheetVersion: SBOS301A; PackageVersion: 4203497/F, 06/2011; PackageReference: RGV16-2160X2160TP; PackageDescription: 16-Pin Plastic Quad Flatpack No-Lead, Body 4 x 4 mm, Pitch 0.65 mm; Supplier 1: Digi-Key; Supplier Part Number 1: 296-21666-2-ND; Supplier 2: Digi-Key; Supplier Part Number 2: 296-21666-1-ND; Supplier 3: Digi-Key; Supplier Part Number 3: 296-21666-6-ND; Supplier 4: Farnell; Supplier Part Number 4: 1754978; Supplier 5: Newark; Supplier Part Number 5: 86W6037; Supplier 6: Newark; Supplier Part Number 6: 36M8091; Supplier 7: Mouser; Supplier Part Number 7: 595-LOG114AIRGVT; Eco-Plan: Green (RoHS & no Sb/Br); SubFamily: Logarithmic Amplifier; Mounting Technology: Surface Mount; Code_JEDEC: MO-220; ComponentLink1Description: Manufacturer URL; ComponentLink1URL: http://www.ti.com/; ComponentLink2Description: Datasheet; ComponentLink2URL: http://www.ti.com/general/docs/lit/getliterature.tsp?genericPartNumber=LOG114&fileType=pdf; ComponentLink3Description: Package Specification; ComponentLink3URL: http://www.ti.com/litv/pdf/mpqf121e
footprint TI-RGV16-2160X2160TP_V (QFN, 16-Leads, Body 4x4mm, Pitch 0.65mm, Thermal Pad 2.16 x 2.16mm)
pins: 1 VREFGND (power), 2 NC, 3 I2 (in), 4 I1 (in), 5 VCM IN (in), 6 V- (power), 7 COM (power), 8 V+ (power), 9 VLOGOUT (out), 10 IN4+ (in), 11 IN4- (in), 12 VO4 (out), 13 IN5+ (in), 14 IN5- (in), 15 VO5 (out), 16 VREF (in), 17 EP (power)

## LOG114AIRGVTG4
designator U?
Precision High-Speed Logarithmic Amplifier with 2.5 V Reference and Uncommitted Output Operational Amplifier, -40 to 85 degC, 16-pin QFN (RGV16), Green (RoHS & no Sb/Br); Manufacturer: Texas Instruments; PartNumber: LOG114AIRGVTG4; Conformity Error (initial 5 decades)(Max)(%): 0.2; Input Current Range(Max)(mA): 10; Input Current Range(Min)(nA): 0.1; Iq(Max)(mA): 15; Offset Voltage (Input Amplifiers)(Max)(mV): 4; Reference Type: Internal; Scale Factor(V/decade): 0.375; Vs (+/-)(Max)(V): 11; Vs (+/-)(Min)(V): 4.8; DatasheetVersion: SBOS301A; PackageVersion: 4203497/F, 06/2011; PackageReference: RGV16-2160X2160TP; PackageDescription: 16-Pin Plastic Quad Flatpack No-Lead, Body 4 x 4 mm, Pitch 0.65 mm; Supplier 1: Digi-Key; Supplier Part Number 1: LOG114AIRGVTG4-ND; Supplier 2: Mouser; Supplier Part Number 2: 595-LOG114AIRGVTG4; Eco-Plan: Green (RoHS & no Sb/Br); SubFamily: Logarithmic Amplifier; Mounting Technology: Surface Mount; Code_JEDEC: MO-220; ComponentLink1Description: Manufacturer URL; ComponentLink1URL: http://www.ti.com/; ComponentLink2Description: Datasheet; ComponentLink2URL: http://www.ti.com/general/docs/lit/getliterature.tsp?genericPartNumber=LOG114&fileType=pdf; ComponentLink3Description: Package Specification; ComponentLink3URL: http://www.ti.com/litv/pdf/mpqf121e
footprint TI-RGV16-2160X2160TP_V (QFN, 16-Leads, Body 4x4mm, Pitch 0.65mm, Thermal Pad 2.16 x 2.16mm)
pins: 1 VREFGND (power), 2 NC, 3 I2 (in), 4 I1 (in), 5 VCM IN (in), 6 V- (power), 7 COM (power), 8 V+ (power), 9 VLOGOUT (out), 10 IN4+ (in), 11 IN4- (in), 12 VO4 (out), 13 IN5+ (in), 14 IN5- (in), 15 VO5 (out), 16 VREF (in), 17 EP (power)

## LOG2112AIDW
designator U?
Precision Logarithmic and Log Ratio Amplifier with On-Chip 2.5 V Voltage Reference, -40 to 85 degC, 16-pin SOIC (DW16), Green (RoHS & no Sb/Br); Manufacturer: Texas Instruments; PartNumber: LOG2112AIDW; Conformity Error (initial 5 decades)(Max)(%): 0.2; Full-Scale Output Voltage(Max)(+/- V): 1.5; Full-Scale Output Voltage(Min)(+/- V): 1.2; Input Current Range(Max)(mA): 3.5; Input Current Range(Min)(nA): 0.1; Reference Type: Internal; Scale Factor(V/decade): 0.5; SubFamily: Logarithmic Amplifier; Vs (+/-)(Max)(V): 18; Vs (+/-)(Min)(V): 4.5; DatasheetVersion: SBOS246D; PackageVersion: 4040000-2/G, 01/2011; PackageReference: DW16; PackageDescription: 16-Pin Plastic Small Outline, Body 10.30 x 7.50 mm, Pitch 1.27 mm; Supplier 1: Digi-Key; Supplier Part Number 1: 296-13815-5-ND; Supplier 2: Newark; Supplier Part Number 2: 02H5271; Supplier 3: Mouser; Supplier Part Number 3: 595-LOG2112AIDW; Eco-Plan: Green (RoHS & no Sb/Br); Iq(Max)(mA): 3.5; Offset Voltage (Input Amplifiers)(Max)(mV): 1.5; Mounting Technology: Surface Mount; Code_JEDEC: MS-013; ComponentLink1Description: Manufacturer URL; ComponentLink1URL: http://www.ti.com/; ComponentLink2Description: Datasheet; ComponentLink2URL: http://www.ti.com/general/docs/lit/getliterature.tsp?genericPartNumber=LOG2112&fileType=pdf; ComponentLink3Description: Package Specification; ComponentLink3URL: http://www.ti.com/litv/pdf/msoi003g
footprint TI-DW16_N (SOIC, 16-Leads, Body 10.5x7.6mm, Pitch 1.27mm, IPC Medium Density)
footprint TI-DW16_L (SOIC, 16-Leads, Body 10.5x7.6mm, Pitch 1.27mm, IPC High Density)
footprint TI-DW16_M (SOIC, 16-Leads, Body 10.5x7.6mm, Pitch 1.27mm, IPC Low Density)
pins: 1 I1A (in), 2 I2A (in), 3 IN3A+ (in), 4 IN3A- (in), 5 VLOGOUTA (out), 6 V+ (power), 7 VO3A (out), 8 GND (power), 9 VREF (in), 10 VO3B (out), 11 V- (power), 12 VLOGOUTB (out), 13 IN3B- (in), 14 IN3B+ (in), 15 I2B (in), 16 I1B (in)

## LOG2112AIDWE4
designator U?
Precision Logarithmic and Log Ratio Amplifier with On-Chip 2.5 V Voltage Reference, -40 to 85 degC, 16-pin SOIC (DW16), Green (RoHS & no Sb/Br); Manufacturer: Texas Instruments; PartNumber: LOG2112AIDWE4; Conformity Error (initial 5 decades)(Max)(%): 0.2; Full-Scale Output Voltage(Max)(+/- V): 1.5; Full-Scale Output Voltage(Min)(+/- V): 1.2; Input Current Range(Max)(mA): 3.5; Input Current Range(Min)(nA): 0.1; Reference Type: Internal; Scale Factor(V/decade): 0.5; SubFamily: Logarithmic Amplifier; Vs (+/-)(Max)(V): 18; Vs (+/-)(Min)(V): 4.5; DatasheetVersion: SBOS246D; PackageVersion: 4040000-2/G, 01/2011; PackageReference: DW16; PackageDescription: 16-Pin Plastic Small Outline, Body 10.30 x 7.50 mm, Pitch 1.27 mm; Supplier 1: Digi-Key; Supplier Part Number 1: LOG2112AIDWE4-ND; Supplier 2: Mouser; Supplier Part Number 2: 595-LOG2112AIDWE4; Eco-Plan: Green (RoHS & no Sb/Br); Iq(Max)(mA): 3.5; Offset Voltage (Input Amplifiers)(Max)(mV): 1.5; Mounting Technology: Surface Mount; Code_JEDEC: MS-013; ComponentLink1Description: Manufacturer URL; ComponentLink1URL: http://www.ti.com/; ComponentLink2Description: Datasheet; ComponentLink2URL: http://www.ti.com/general/docs/lit/getliterature.tsp?genericPartNumber=LOG2112&fileType=pdf; ComponentLink3Description: Package Specification; ComponentLink3URL: http://www.ti.com/litv/pdf/msoi003g
footprint TI-DW16_N (SOIC, 16-Leads, Body 10.5x7.6mm, Pitch 1.27mm, IPC Medium Density)
footprint TI-DW16_L (SOIC, 16-Leads, Body 10.5x7.6mm, Pitch 1.27mm, IPC High Density)
footprint TI-DW16_M (SOIC, 16-Leads, Body 10.5x7.6mm, Pitch 1.27mm, IPC Low Density)
pins: 1 I1A (in), 2 I2A (in), 3 IN3A+ (in), 4 IN3A- (in), 5 VLOGOUTA (out), 6 V+ (power), 7 VO3A (out), 8 GND (power), 9 VREF (in), 10 VO3B (out), 11 V- (power), 12 VLOGOUTB (out), 13 IN3B- (in), 14 IN3B+ (in), 15 I2B (in), 16 I1B (in)

## LOG2112AIDWR
designator U?
Precision Logarithmic and Log Ratio Amplifier with On-Chip 2.5 V Voltage Reference, -40 to 85 degC, 16-pin SOIC (DW16), Green (RoHS & no Sb/Br); Manufacturer: Texas Instruments; PartNumber: LOG2112AIDWR; Conformity Error (initial 5 decades)(Max)(%): 0.2; Full-Scale Output Voltage(Max)(+/- V): 1.5; Full-Scale Output Voltage(Min)(+/- V): 1.2; Input Current Range(Max)(mA): 3.5; Input Current Range(Min)(nA): 0.1; Reference Type: Internal; Scale Factor(V/decade): 0.5; SubFamily: Logarithmic Amplifier; Vs (+/-)(Max)(V): 18; Vs (+/-)(Min)(V): 4.5; DatasheetVersion: SBOS246D; PackageVersion: 4040000-2/G, 01/2011; PackageReference: DW16; PackageDescription: 16-Pin Plastic Small Outline, Body 10.30 x 7.50 mm, Pitch 1.27 mm; Supplier 1: Digi-Key; Supplier Part Number 1: LOG2112AIDWR-ND; Supplier 2: Mouser; Supplier Part Number 2: 595-LOG2112AIDWR; Eco-Plan: Green (RoHS & no Sb/Br); Iq(Max)(mA): 3.5; Offset Voltage (Input Amplifiers)(Max)(mV): 1.5; Mounting Technology: Surface Mount; Code_JEDEC: MS-013; ComponentLink1Description: Manufacturer URL; ComponentLink1URL: http://www.ti.com/; ComponentLink2Description: Datasheet; ComponentLink2URL: http://www.ti.com/general/docs/lit/getliterature.tsp?genericPartNumber=LOG2112&fileType=pdf; ComponentLink3Description: Package Specification; ComponentLink3URL: http://www.ti.com/litv/pdf/msoi003g
footprint TI-DW16_N (SOIC, 16-Leads, Body 10.5x7.6mm, Pitch 1.27mm, IPC Medium Density)
footprint TI-DW16_L (SOIC, 16-Leads, Body 10.5x7.6mm, Pitch 1.27mm, IPC High Density)
footprint TI-DW16_M (SOIC, 16-Leads, Body 10.5x7.6mm, Pitch 1.27mm, IPC Low Density)
pins: 1 I1A (in), 2 I2A (in), 3 IN3A+ (in), 4 IN3A- (in), 5 VLOGOUTA (out), 6 V+ (power), 7 VO3A (out), 8 GND (power), 9 VREF (in), 10 VO3B (out), 11 V- (power), 12 VLOGOUTB (out), 13 IN3B- (in), 14 IN3B+ (in), 15 I2B (in), 16 I1B (in)

## LOG2112AIDWRE4
designator U?
Precision Logarithmic and Log Ratio Amplifier with On-Chip 2.5 V Voltage Reference, -40 to 85 degC, 16-pin SOIC (DW16), Green (RoHS & no Sb/Br); Manufacturer: Texas Instruments; PartNumber: LOG2112AIDWRE4; Conformity Error (initial 5 decades)(Max)(%): 0.2; Full-Scale Output Voltage(Max)(+/- V): 1.5; Full-Scale Output Voltage(Min)(+/- V): 1.2; Input Current Range(Max)(mA): 3.5; Input Current Range(Min)(nA): 0.1; Reference Type: Internal; Scale Factor(V/decade): 0.5; SubFamily: Logarithmic Amplifier; Vs (+/-)(Max)(V): 18; Vs (+/-)(Min)(V): 4.5; DatasheetVersion: SBOS246D; PackageVersion: 4040000-2/G, 01/2011; PackageReference: DW16; PackageDescription: 16-Pin Plastic Small Outline, Body 10.30 x 7.50 mm, Pitch 1.27 mm; Supplier 1: Digi-Key; Supplier Part Number 1: LOG2112AIDWRE4-ND; Supplier 2: Mouser; Supplier Part Number 2: 595-LOG2112AIDWRE4; Eco-Plan: Green (RoHS & no Sb/Br); Iq(Max)(mA): 3.5; Offset Voltage (Input Amplifiers)(Max)(mV): 1.5; Mounting Technology: Surface Mount; Code_JEDEC: MS-013; ComponentLink1Description: Manufacturer URL; ComponentLink1URL: http://www.ti.com/; ComponentLink2Description: Datasheet; ComponentLink2URL: http://www.ti.com/general/docs/lit/getliterature.tsp?genericPartNumber=LOG2112&fileType=pdf; ComponentLink3Description: Package Specification; ComponentLink3URL: http://www.ti.com/litv/pdf/msoi003g
footprint TI-DW16_N (SOIC, 16-Leads, Body 10.5x7.6mm, Pitch 1.27mm, IPC Medium Density)
footprint TI-DW16_L (SOIC, 16-Leads, Body 10.5x7.6mm, Pitch 1.27mm, IPC High Density)
footprint TI-DW16_M (SOIC, 16-Leads, Body 10.5x7.6mm, Pitch 1.27mm, IPC Low Density)
pins: 1 I1A (in), 2 I2A (in), 3 IN3A+ (in), 4 IN3A- (in), 5 VLOGOUTA (out), 6 V+ (power), 7 VO3A (out), 8 GND (power), 9 VREF (in), 10 VO3B (out), 11 V- (power), 12 VLOGOUTB (out), 13 IN3B- (in), 14 IN3B+ (in), 15 I2B (in), 16 I1B (in)
